# Altium footprint library 集成IC.PcbLib: 49 footprints (part 3 of 4)
Each footprint in its own frame and in the unit in brackets; x right, y up, seen from the top. Pads: shape width x height; smd on the part's side, far side on the other; paste and mask are expansions set on the pad; w line width, h text height; cw(c..) or ccw(c..) is an arc to the next point about the centre after c.
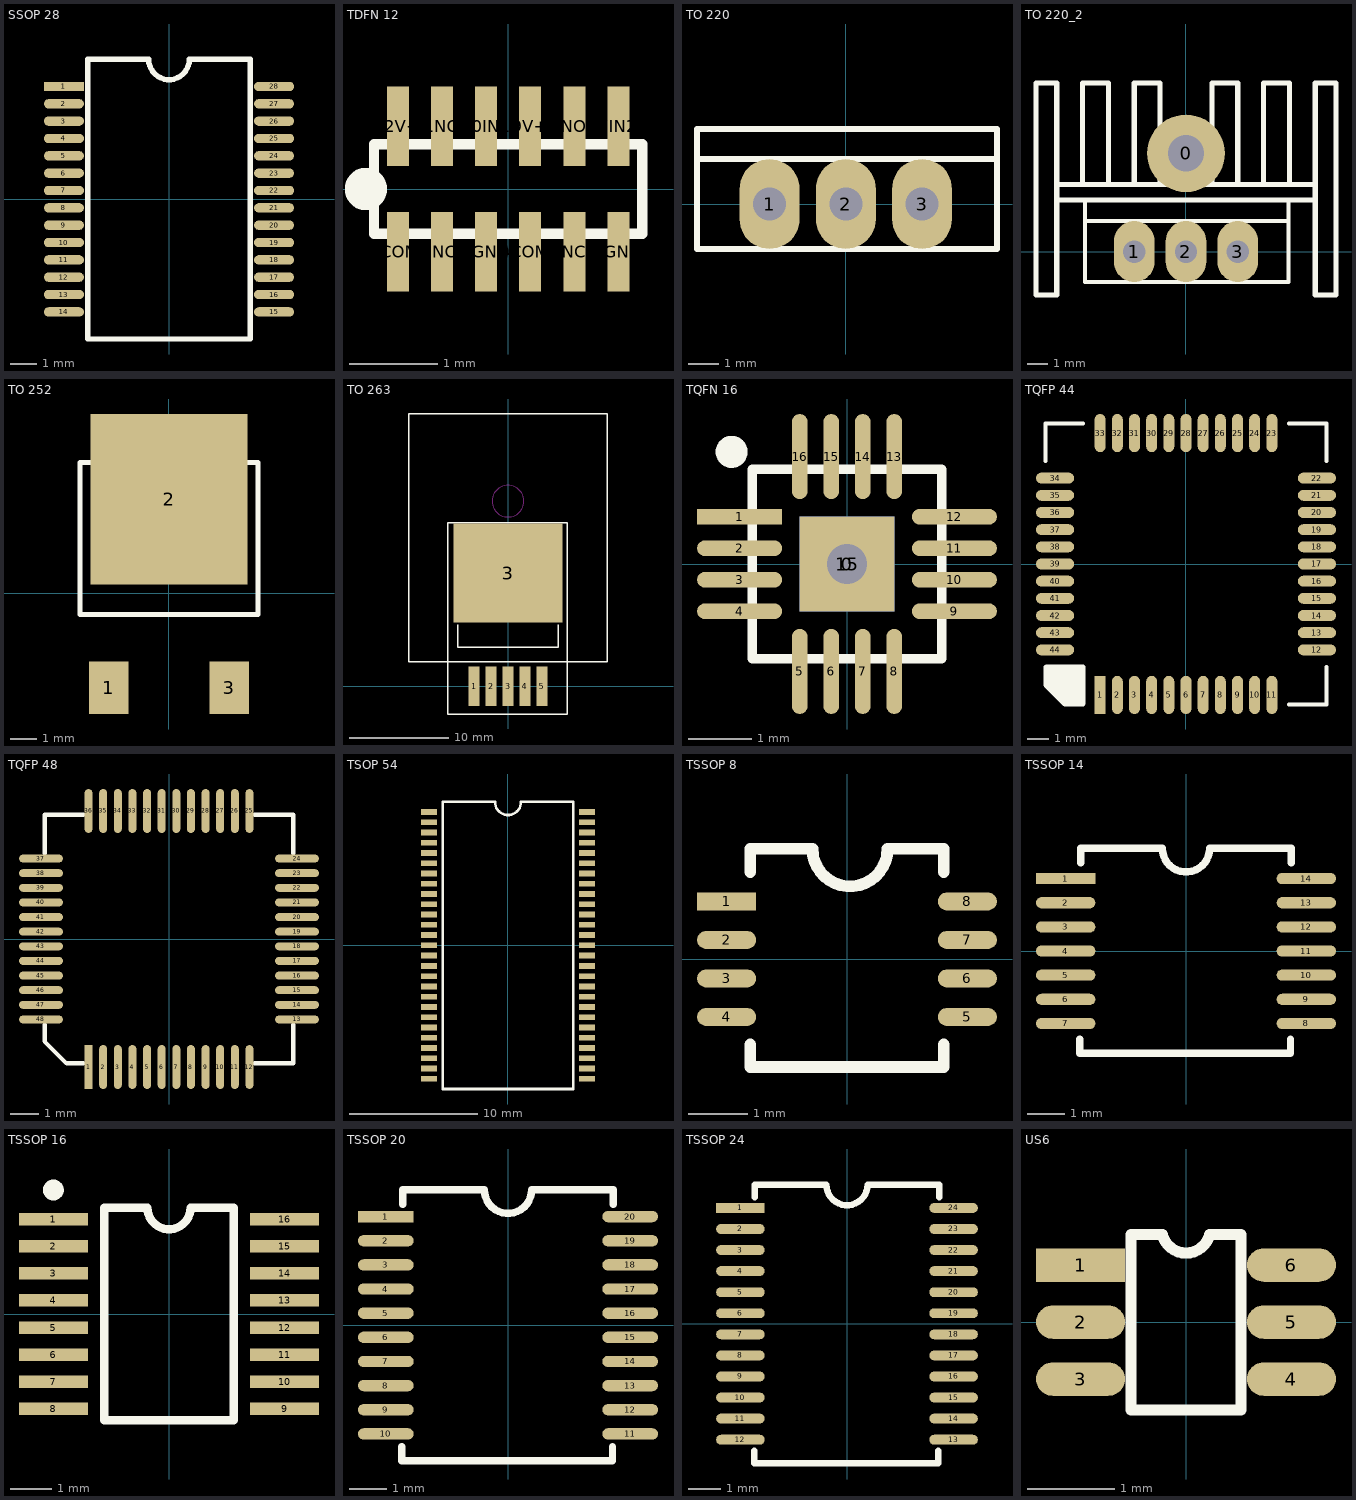
[diagram p2: the footprints below, top view; thin cyan lines are the x and y axes]

## SSOP 28 [mm]
pads (28):
  rect 1.5x0.35 smd: 1(-3.937,4.225)
  oval 1.5x0.35 smd: 2(-3.937,3.575) 3(-3.937,2.925) 4(-3.937,2.275) 5(-3.937,1.625) 6(-3.937,0.975) 7(-3.937,0.325) 8(-3.937,-0.325) 9(-3.937,-0.975) 10(-3.937,-1.625) 11(-3.937,-2.275) 12(-3.937,-2.925) 13(-3.937,-3.575) 14(-3.937,-4.225) 15(3.937,-4.225) 16(3.937,-3.575) 17(3.937,-2.925) 18(3.937,-2.275) 19(3.937,-1.625) 20(3.937,-0.975) 21(3.937,-0.325) 22(3.937,0.325) 23(3.937,0.975) 24(3.937,1.625) 25(3.937,2.275) 26(3.937,2.925) 27(3.937,3.575) 28(3.937,4.225)
Top Overlay:
  lines w0.203: -3.048,-5.241 -3.048,5.241 -0.762,5.241 ccw(c0,5.241) 0.762,5.241 3.048,5.241 3.048,-5.241 -3.048,-5.241
3D body: height 1.65, standoff -0.03, extent -3.852,-5.1 3.852,5.1

## TDFN 12 [mm]
pads (12):
  rect 0.25x0.9 smd: "1 COM1"(-1.25,-0.711) "2 NC1"(-0.75,-0.711) 3GND(-0.25,-0.711) 4COM2(0.25,-0.711) 5NC2(0.75,-0.711) 6GND(1.25,-0.711) 7IN2(1.25,0.711) 8NO2(0.75,0.711) 9V+(0.25,0.711) 10IN1(-0.25,0.711) 11NO1(-0.75,0.711) 12V+(-1.25,0.711)
Top Overlay:
  circle w0.3: c-1.614,0 r0.09
  lines w0.114: -1.521,-0.508 1.521,-0.508 1.521,0.508 -1.521,0.508 -1.521,-0.508

## TO 220 [mm]
pads (3):
  oval 2x3 hole 1.1: 1(-2.54,0) 2(0,0) 3(2.54,0)
Top Overlay:
  lines w0.2: -4.96,1.5 5.04,1.5 ; -4.96,-1.5 5.04,-1.5 5.04,2.5 -4.96,2.5 -4.96,-1.5
3D body: height 20.64, standoff -3, extent -5.1,-1.604 5.1,2.896

## TO 220_2 [mm] "带散热架"
pads (4):
  round 3.81 hole 1.778: 0(0,4.826)
  oval 2x3 hole 1.1: 1(-2.54,0) 2(0,0) 3(2.54,0)
Top Overlay:
  lines w0.2: -4.96,1.5 5.04,1.5 ; -4.96,-1.5 -4.96,2.5 5.04,2.5 5.04,-1.5 -4.96,-1.5
  lines w0.254: -6.35,2.54 6.35,2.54 ; -6.35,3.302 6.35,3.302 ; -5.08,3.302 -5.08,8.28 -3.81,8.28 -3.81,3.302 ; -2.54,3.302 -2.54,8.28 -1.27,8.28 -1.27,3.302 ; 1.27,3.302 1.27,8.28 2.54,8.28 2.54,3.302 ; 3.81,3.302 3.81,8.28 5.08,8.28 5.08,3.302 ; 7.366,8.255 7.366,-2.134 6.35,-2.134 6.35,8.28 7.366,8.28 ; -7.366,-2.134 -6.35,-2.134 -6.35,8.28 -7.366,8.28 -7.366,-2.134
3D body: height 25, standoff -3, extent -7.375,-2.134 7.325,8.266

## TO 252 [mm]
pads (3):
  rect 1.5x2 smd: 1(-2.3,-3.6) 3(2.3,-3.6)
  rect 6x6.5 smd: 2(0,3.6)
Top Overlay:
  lines w0.2: -3.4,-0.8 -3.4,5 3.4,5 3.4,-0.8 -3.4,-0.8
3D body: height 2.29, standoff -0.13, extent -3.27,-3.601 3.27,6.337

## TO 263 [mm]
pads (6):
  rect 1.1x4 smd: 1(-3.42,0) 2(-1.71,0) 3(0,0) 4(1.71,0) 5(3.42,0)
  rect 11x10 smd: 3(0,11.43)
Top Overlay:
  lines w0.127: -5.08,6.223 -5.08,3.937 5.08,3.937 5.08,6.223 ; -10,2.5 10,2.5 10,27.5 -10,27.5 -10,2.5 ; -6.096,-2.794 5.969,-2.794 5.969,16.5 -6.096,16.5 -6.096,-2.794
Keep-Out Layer:
  circle w0.114: c0,18.7 r1.6
3D body: height 4.5, standoff 0, extent -5,0.083 5,13.411

## TQFN 16 [mm]
pads (18):
  rect 1.5x1.5 smd: 0(0,0)
  rect 1.35x0.25 smd: 1(-1.702,0.75)
  oval 1.35x0.25 smd: 2(-1.702,0.25) 3(-1.702,-0.25) 4(-1.702,-0.75) 9(1.702,-0.75) 10(1.702,-0.25) 11(1.702,0.25) 12(1.702,0.75)
  oval 0.25x1.35 smd: 5(-0.75,-1.703) 6(-0.25,-1.703) 7(0.25,-1.703) 8(0.75,-1.703) 13(0.75,1.703) 14(0.25,1.703) 15(-0.25,1.703) 16(-0.75,1.703)
  rect 1.5x1.5 smd far side: 15(0,0)
via 0,0 diameter 0.889 hole 0.635
Top Overlay:
  circle w0.254: c-1.829,1.778 r0.127
  lines w0.152: -1.5,-1.5 -1.5,1.5 1.5,1.5 1.5,-1.5 -1.5,-1.5

## TQFP 44 [mil]
pads (44):
  rect 20x70 smd: 1(-157.48,-240.16)
  oval 20x70 smd: 2(-125.98,-240.16) 3(-94.49,-240.16) 4(-62.99,-240.16) 5(-31.5,-240.16) 6(0,-240.16) 7(31.5,-240.16) 8(62.99,-240.16) 9(94.49,-240.16) 10(125.98,-240.16) 11(157.48,-240.16) 23(157.48,240.16) 24(125.98,240.16) 25(94.49,240.16) 26(62.99,240.16) 27(31.5,240.16) 28(0,240.16) 29(-31.5,240.16) 30(-62.99,240.16) 31(-94.49,240.16) 32(-125.98,240.16) 33(-157.48,240.16)
  oval 70x20 smd: 12(240.16,-157.48) 13(240.16,-125.98) 14(240.16,-94.49) 15(240.16,-62.99) 16(240.16,-31.5) 17(240.16,0) 18(240.16,31.5) 19(240.16,62.99) 20(240.16,94.49) 21(240.16,125.98) 22(240.16,157.48) 34(-240.16,157.48) 35(-240.16,125.98) 36(-240.16,94.49) 37(-240.16,62.99) 38(-240.16,31.5) 39(-240.16,0) 40(-240.16,-31.5) 41(-240.16,-62.99) 42(-240.16,-94.49) 43(-240.16,-125.98) 44(-240.16,-157.48)
Top Overlay:
  lines w7.87: -257.87,-188.98 -257.87,-222.44 -222.44,-257.87 -188.98,-257.87 ; -257.87,188.98 -257.87,257.87 -188.98,257.87 ; 188.98,-257.87 257.87,-257.87 257.87,-188.98 ; 188.98,257.87 257.87,257.87 257.87,188.98
  lines w10: -255.91,-188.98 -188.98,-188.98 -188.98,-255.91 -216.54,-255.91 -251.97,-220.47 -251.97,-196.85 -196.85,-196.85 -196.85,-248.03 -212.6,-248.03 -244.09,-216.54 -244.09,-204.72 -204.72,-204.72 -204.72,-240.16 -208.66,-240.16 -236.22,-212.6 -212.6,-212.6 -212.6,-232.28 -212.6,-224.41 -220.47,-216.54
3D body: height 43.31, standoff 0, extent -236,-236.22 236.44,236.22

## TQFP 48 [mil]
pads (48):
  rect 11x60 smd: 1(-110,-175)
  oval 11x60 smd: 2(-90,-175) 3(-70,-175) 4(-50,-175) 5(-30,-175) 6(-10,-175) 7(10,-175) 8(30,-175) 9(50,-175) 10(70,-175) 11(90,-175) 12(110,-175) 25(110,175) 26(90,175) 27(70,175) 28(50,175) 29(30,175) 30(10,175) 31(-10,175) 32(-30,175) 33(-50,175) 34(-70,175) 35(-90,175) 36(-110,175)
  oval 60x11 smd: 13(175,-110) 14(175,-90) 15(175,-70) 16(175,-50) 17(175,-30) 18(175,-10) 19(175,10) 20(175,30) 21(175,50) 22(175,70) 23(175,90) 24(175,110) 37(-175,110) 38(-175,90) 39(-175,70) 40(-175,50) 41(-175,30) 42(-175,10) 43(-175,-10) 44(-175,-30) 45(-175,-50) 46(-175,-70) 47(-175,-90) 48(-175,-110)
Top Overlay:
  lines w6: -170,-117 -170,-140 -140,-170 -117,-170 ; -170,117 -170,170 -117,170 ; 117,-170 170,-170 170,-117 ; 117,170 170,170 170,117
3D body: height 43.31, standoff 0, extent -177.51,-177.51 177.51,177.51

## TSOP 54 [mm]
pads (54):
  rect 1.27x0.45 smd: 1(-6.154,10.4) 2(-6.154,9.6) 3(-6.154,8.8) 4(-6.154,8) 5(-6.154,7.2) 6(-6.154,6.4) 7(-6.154,5.6) 8(-6.154,4.8) 9(-6.154,4) 10(-6.154,3.2) 11(-6.154,2.4) 12(-6.154,1.6) 13(-6.154,0.8) 14(-6.154,0) 15(-6.154,-0.8) 16(-6.154,-1.6) 17(-6.154,-2.4) 18(-6.154,-3.2) 19(-6.154,-4) 20(-6.154,-4.8) 21(-6.154,-5.6) 22(-6.154,-6.4) 23(-6.154,-7.2) 24(-6.154,-8) 25(-6.154,-8.8) 26(-6.154,-9.6) 27(-6.154,-10.4) 28(6.154,-10.4) 29(6.154,-9.6) 30(6.154,-8.8) 31(6.154,-8) 32(6.154,-7.2) 33(6.154,-6.4) 34(6.154,-5.6) 35(6.154,-4.8) 36(6.154,-4) 37(6.154,-3.2) 38(6.154,-2.4) 39(6.154,-1.6) 40(6.154,-0.8) 41(6.154,0) 42(6.154,0.8) 43(6.154,1.6) 44(6.154,2.4) 45(6.154,3.2) 46(6.154,4) 47(6.154,4.8) 48(6.154,5.6) 49(6.154,6.4) 50(6.154,7.2) 51(6.154,8) 52(6.154,8.8) 53(6.154,9.6) 54(6.154,10.4)
Top Overlay:
  lines w0.203: -5.1,-11.2 -5.1,11.2 -1.016,11.2 ccw(c0,11.176) 1.016,11.2 5.1,11.2 5.1,-11.2 -5.1,-11.2
3D body: height 1.3, standoff -0.4, extent -5.893,-11.135 5.867,11.085

## TSSOP 8 [mm]
pads (8):
  rect 1x0.3 smd: 1(-2.032,0.975)
  oval 1x0.3 smd: 2(-2.032,0.325) 3(-2.032,-0.325) 4(-2.032,-0.975) 5(2.032,-0.975) 6(2.032,-0.325) 7(2.032,0.325) 8(2.032,0.975)
Top Overlay:
  lines w0.2: -1.632,-1.442 -1.632,-1.817 1.632,-1.817 1.632,-1.442 ; -1.632,1.471 -1.632,1.864 -0.584,1.864 ccw(c0.051,1.864) 0.686,1.864 1.632,1.864 1.632,1.471
3D body: height 1.03, standoff -0.02, extent -2.052,-1.499 2.052,1.501

## TSSOP 14 [mm]
pads (14):
  rect 1.6x0.3 smd: 1(-3.238,1.95)
  oval 1.6x0.3 smd: 2(-3.238,1.3) 3(-3.238,0.65) 4(-3.238,0) 5(-3.238,-0.65) 6(-3.238,-1.3) 7(-3.238,-1.95) 8(3.238,-1.95) 9(3.238,-1.3) 10(3.238,-0.65) 11(3.238,0) 12(3.238,0.65) 13(3.238,1.3) 14(3.238,1.95)
Top Overlay:
  lines w0.2: -2.864,-2.374 -2.864,-2.749 2.813,-2.749 2.813,-2.374 ; -2.839,2.37 -2.839,2.763 -0.635,2.763 ccw(c0,2.763) 0.635,2.763 ; 0.699,2.763 2.839,2.763 2.839,2.37
3D body: height 1.03, standoff -0.02, extent -3.202,-2.5 3.202,2.5

## TSSOP 16 [mm] "2046"
pads (16):
  rect 1.65x0.3 smd: 1(-2.775,2.275) 2(-2.775,1.625) 3(-2.775,0.975) 4(-2.775,0.325) 5(-2.775,-0.325) 6(-2.775,-0.975) 7(-2.775,-1.625) 8(-2.775,-2.275) 9(2.775,-2.275) 10(2.775,-1.625) 11(2.775,-0.975) 12(2.775,-0.325) 13(2.775,0.325) 14(2.775,0.975) 15(2.775,1.625) 16(2.775,2.275)
Top Overlay:
  circle w0.25: c-2.775,2.975 r0.125
  lines w0.2: -1.55,-2.55 -1.55,2.55 -0.517,2.55 ccw(c0,2.55) 0.517,2.55 1.55,2.55 1.55,-2.55 -1.55,-2.55
3D body: height 1.1, standoff 0, extent -3.2,-2.5 3.2,2.5

## TSSOP 20 [mm]
pads (20):
  rect 1.5x0.305 smd: 1(-3.288,2.925)
  oval 1.5x0.305 smd: 2(-3.288,2.275) 3(-3.288,1.625) 4(-3.288,0.975) 5(-3.288,0.325) 6(-3.288,-0.325) 7(-3.288,-0.975) 8(-3.288,-1.625) 9(-3.288,-2.275) 10(-3.288,-2.925) 11(3.288,-2.925) 12(3.288,-2.275) 13(3.288,-1.625) 14(3.288,-0.975) 15(3.288,-0.325) 16(3.288,0.325) 17(3.288,0.975) 18(3.288,1.625) 19(3.288,2.275) 20(3.288,2.925)
Top Overlay:
  lines w0.2: -2.864,-3.27 -2.864,-3.645 2.813,-3.645 2.813,-3.27 ; -2.839,3.252 -2.839,3.645 -0.635,3.645 ccw(c0,3.645) 0.635,3.645 ; 0.699,3.645 2.839,3.645 2.839,3.252
3D body: height 1.03, standoff -0.02, extent -3.202,-3.25 3.202,3.25

## TSSOP 24 [mm]
pads (24):
  rect 1.5x0.305 smd: 1(-3.288,3.575)
  oval 1.5x0.305 smd: 2(-3.288,2.925) 3(-3.288,2.275) 4(-3.288,1.625) 5(-3.288,0.975) 6(-3.288,0.325) 7(-3.288,-0.325) 8(-3.288,-0.975) 9(-3.288,-1.625) 10(-3.288,-2.275) 11(-3.288,-2.925) 12(-3.288,-3.575) 13(3.288,-3.575) 14(3.288,-2.925) 15(3.288,-2.275) 16(3.288,-1.625) 17(3.288,-0.975) 18(3.288,-0.325) 19(3.288,0.325) 20(3.288,0.975) 21(3.288,1.625) 22(3.288,2.275) 23(3.288,2.925) 24(3.288,3.575)
Top Overlay:
  lines w0.2: -2.864,-3.92 -2.864,-4.295 2.813,-4.295 2.813,-3.92 ; -2.839,3.902 -2.839,4.295 -0.635,4.295 ccw(c0,4.295) 0.635,4.295 ; 0.699,4.295 2.839,4.295 2.839,3.902
3D body: height 1.2, standoff 0, extent -3.2,-3.9 3.2,3.9

## US6 [mil]
pads (6):
  rect 40x15 smd: 1(-47.32,25.59)
  oval 40x15 smd: 2(-47.32,0) 3(-47.32,-25.59) 4(47.32,-25.59) 5(47.32,0) 6(47.32,25.59)
Top Overlay:
  lines w5: -24.61,-39.37 -24.61,39.37 -10.63,39.37 ccw(c0,41.93) 10.63,39.37 24.61,39.37 24.61,-39.37 -24.61,-39.37
3D body: height 33.31, standoff -0.94, extent -41.33,-40.37 41.35,38.37